# Altium footprint library Active.PcbLib: 308 footprints (part 20 of 22)
Each footprint in its own frame and in the unit in brackets; x right, y up, seen from the top. Pads: shape width x height; smd on the part's side, far side on the other; paste and mask are expansions set on the pad; w line width, h text height; cw(c..) or ccw(c..) is an arc to the next point about the centre after c.
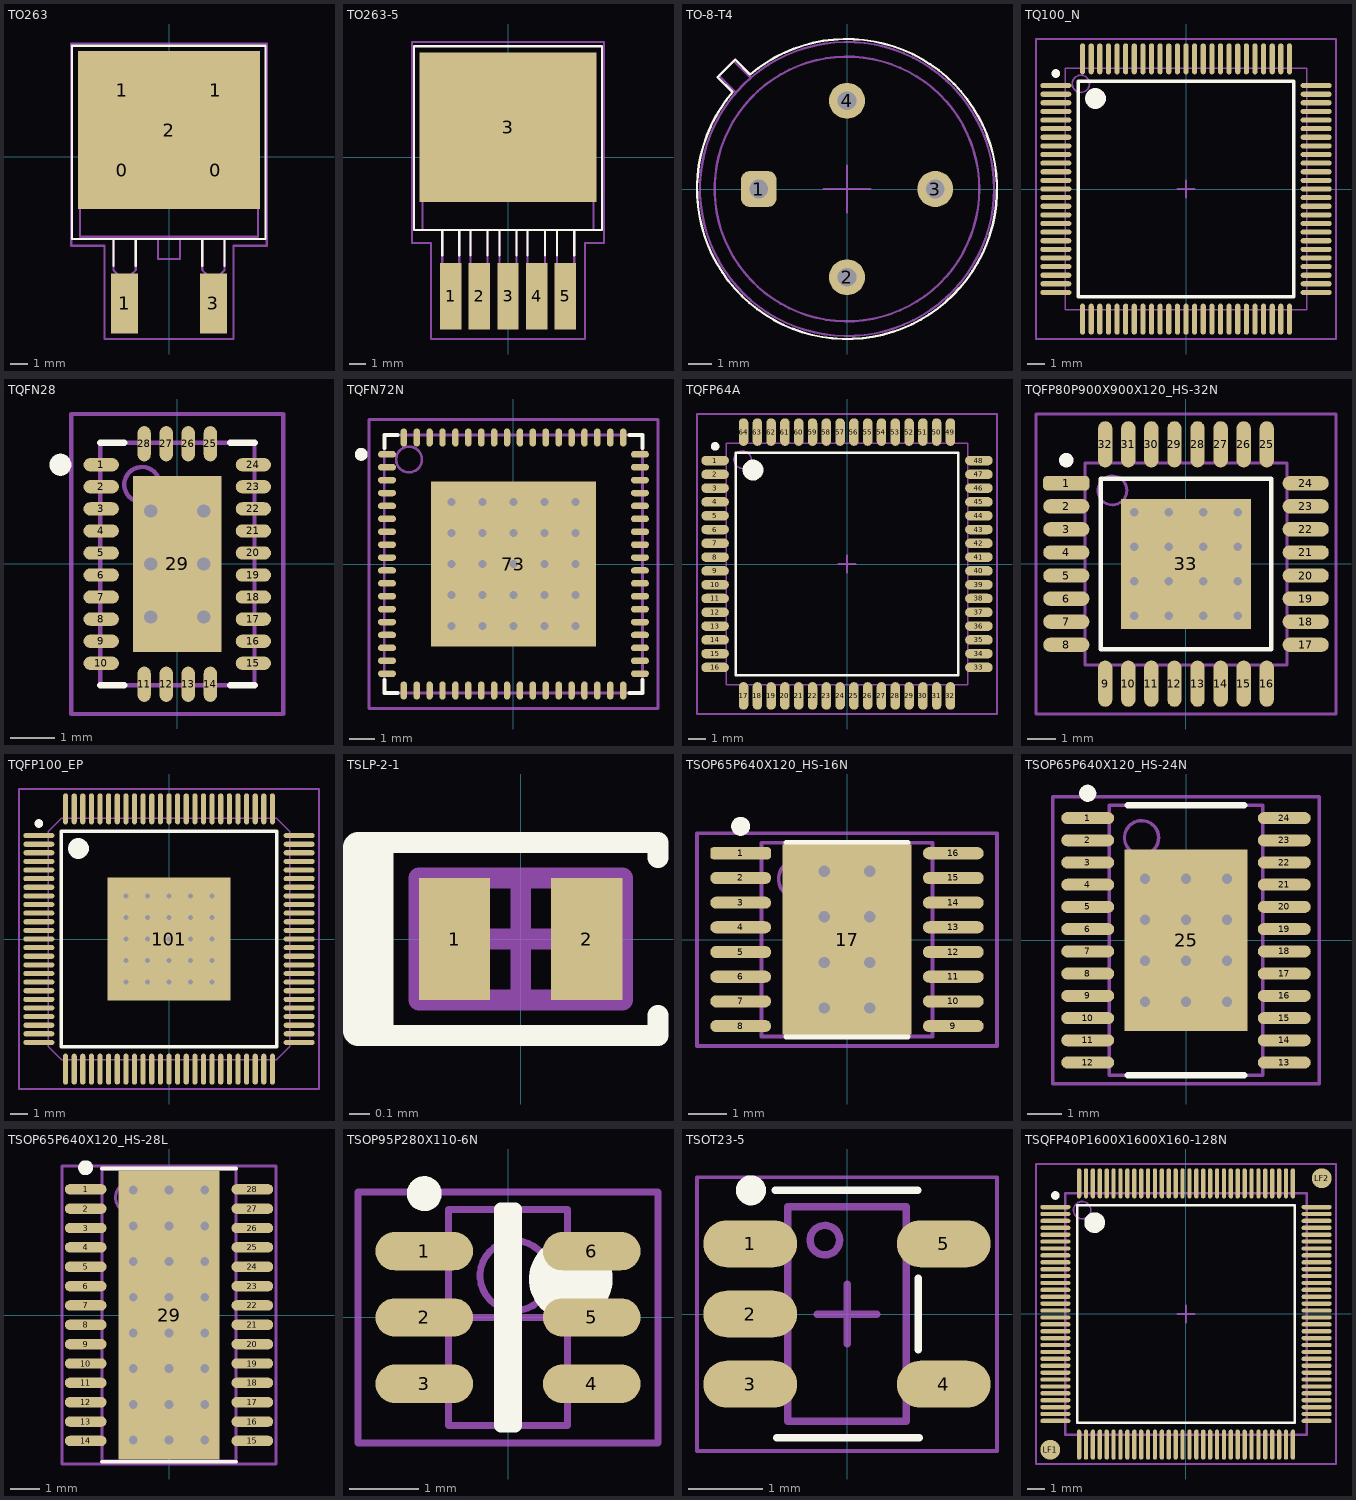
[diagram p19: the footprints below, top view; thin cyan lines are the x and y axes]

## TO263 [mil] "TO263 3pin D2PAK"
height 137.8
pads (7):
  rrect8% 190x160 on Top Paste mask+275.59: 0(-105,-30) 0(105,-30) 1(-105,150) 1(105,150)
  rect 60x135 smd: 1(-100,-330) 3(100,-330)
  rect 410x355 smd paste-196.85: 2(0,60)
Top Overlay:
  lines w5: -125,-245 -125,-185 ; -75,-245 -75,-185 ; 75,-245 75,-185 ; 125,-245 125,-185 ; -218,-185 -218,250 217,250 217,-185 -218,-185
Mechanical 13:
  lines w5: -125,-180 -125,-255 -115,-265 -115,-370 -85,-370 -85,-265 -75,-255 -75,-180 ; -25,-180 -25,-230 25,-230 25,-180 ; 75,-180 75,-255 85,-265 85,-370 115,-370 115,-265 125,-255 125,-180 ; -200,-180 -200,215 -120,230 120,230 200,215 200,-180 -200,-180
  lines w6: -200,180 200,180
Mechanical 15:
  lines w5: -220,-200 -145,-200 -145,-410 145,-410 145,-200 220,-200 220,255 -220,255 -220,-200
3D body: height 105, standoff 80, extent -25,-230 25,-180
3D body: height 105, standoff 80, extent 75,-265 125,-180
3D body: height 105, standoff 0, extent 85,-280 115,-265
3D body: height 20, standoff 0, extent 85,-370 115,-280
3D body: height 20, standoff 0, extent -115,-370 -85,-280
3D body: height 105, standoff 0, extent -115,-280 -85,-265
3D body: height 105, standoff 80, extent -125,-265 -75,-180
3D body: height 175, standoff 0, extent -200,-180 200,180
3D body: height 50, standoff 0, extent -200,180 200,230

## TO263-5 [mil]
height 137.8
pads (6):
  rect 50x155 smd: 1(-134,-325) 2(-67,-325) 3(0,-325) 4(67,-325) 5(134,-325)
  rect 414.02x350 smd paste-393.7: 3(0,70)
Top Overlay:
  lines w5: -154,-230 -154,-170 ; -114,-230 -114,-170 ; -88,-230 -88,-170 ; -48,-230 -48,-170 ; -20,-230 -20,-170 ; 20,-230 20,-170 ; 46,-230 46,-170 ; 87,-230 87,-170 ; 115,-230 115,-170 ; 155,-230 155,-170 ; -220,-170 220,-170 220,260 -220,260 -220,-170
Top Paste:
  circle w35.43: c165.35,-59.06 r17.72
  circle w35.43: c82.68,-59.06 r17.72
  circle w35.43: c-165.35,-59.06 r17.72
  circle w35.43: c-82.68,-59.06 r17.72
  circle w35.43: c0,-59.06 r17.72
  circle w35.43: c0,27.56 r17.72
  circle w35.43: c-82.68,27.56 r17.72
  circle w35.43: c-165.35,27.56 r17.72
  circle w35.43: c82.68,27.56 r17.72
  circle w35.43: c165.35,27.56 r17.72
  circle w35.43: c0,114.17 r17.72
  circle w35.43: c-82.68,114.17 r17.72
  circle w35.43: c-165.35,114.17 r17.72
  circle w35.43: c82.68,114.17 r17.72
  circle w35.43: c165.35,114.17 r17.72
  circle w35.43: c0,200.79 r17.72
  circle w35.43: c-82.68,200.79 r17.72
  circle w35.43: c-165.35,200.79 r17.72
  circle w35.43: c82.68,200.79 r17.72
  circle w35.43: c165.35,200.79 r17.72
Mechanical 13:
  lines w5: -154,-170 -154,-340 -114,-340 -114,-170 ; -88,-170 -88,-340 -48,-340 -48,-170 200,-170 ; -20,-170 -20,-340 20,-340 20,-170 ; 46,-170 46,-340 86,-340 ; 87,-340 87,-170 ; 115,-170 115,-340 155,-340 155,-170 ; -200,170 200,170 ; -200,170 -200,-170 200,-170 ; -200,170 -200,220 200,220 200,170 ; 200,-170 200,170
Mechanical 15:
  lines w4: -40,0 40,0 ; 0,-40 0,40
  lines w5: -225,-200 -180,-200 -180,-425 180,-425 180,-200 225,-200 225,270 -225,270 -225,-200
3D body: height 137.8, standoff 0, extent -200,-170 200,170
3D body: height 39.37, standoff 0, extent -200,170 200,220

## TO-8-T4 [mm] "TO-8 4pin metal"
height 7
pads (4):
  rrect50% 1.55x1.55 hole 0.8: 1(-3.81,0)
  round 1.55 hole 0.8: 2(0,-3.81) 3(3.81,0) 4(0,3.81)
Top Overlay:
  lines w0.1: -4.944,4.184 ccw(c0,0) -4.184,4.944
  lines w0.102: -4.944,4.184 -5.587,4.826 -5.588,4.826 -4.826,5.588 -4.184,4.946 -4.184,4.944
Mechanical 13:
  circle w0.1: c0,0 r6.35
  circle w0.1: c0,0 r5.715
  lines w0.102: -4.826,4.191 -5.524,4.889 -4.889,5.524 -4.191,4.826
Mechanical 15:
  lines w0.102: -1.016,0 1.016,0 ; 0,-1.016 0,1.016
3D body: height 7, standoff 0, extent -5.715,-5.715 5.715,5.715
3D body: height 1, standoff 0, extent -6.35,-6.35 6.35,6.35
3D body: height 1, standoff 0, extent -5.524,4.191 -4.191,5.524

## TQ100_N [mm] "Thin QFP 100, 14x14mm, R0.5mm, IPC Medium Density"
height 1.6
pads (100):
  oval 1.8x0.3 smd mask+0.051: 1(-7.55,6) 2(-7.55,5.5) 3(-7.55,5) 4(-7.55,4.5) 5(-7.55,4) 6(-7.55,3.5) 7(-7.55,3) 8(-7.55,2.5) 9(-7.55,2) 10(-7.55,1.5) 11(-7.55,1) 12(-7.55,0.5) 13(-7.55,0) 14(-7.55,-0.5) 15(-7.55,-1) 16(-7.55,-1.5) 17(-7.55,-2) 18(-7.55,-2.5) 19(-7.55,-3) 20(-7.55,-3.5) 21(-7.55,-4) 22(-7.55,-4.5) 23(-7.55,-5) 24(-7.55,-5.5) 25(-7.55,-6) 51(7.55,-6) 52(7.55,-5.5) 53(7.55,-5) 54(7.55,-4.5) 55(7.55,-4) 56(7.55,-3.5) 57(7.55,-3) 58(7.55,-2.5) 59(7.55,-2) 60(7.55,-1.5) 61(7.55,-1) 62(7.55,-0.5) 63(7.55,0) 64(7.55,0.5) 65(7.55,1) 66(7.55,1.5) 67(7.55,2) 68(7.55,2.5) 69(7.55,3) 70(7.55,3.5) 71(7.55,4) 72(7.55,4.5) 73(7.55,5) 74(7.55,5.5) 75(7.55,6)
  oval 0.3x1.8 smd mask+0.051: 26(-6,-7.55) 27(-5.5,-7.55) 28(-5,-7.55) 29(-4.5,-7.55) 30(-4,-7.55) 31(-3.5,-7.55) 32(-3,-7.55) 33(-2.5,-7.55) 34(-2,-7.55) 35(-1.5,-7.55) 36(-1,-7.55) 37(-0.5,-7.55) 38(0,-7.55) 39(0.5,-7.55) 40(1,-7.55) 41(1.5,-7.55) 42(2,-7.55) 43(2.5,-7.55) 44(3,-7.55) 45(3.5,-7.55) 46(4,-7.55) 47(4.5,-7.55) 48(5,-7.55) 49(5.5,-7.55) 50(6,-7.55) 76(6,7.55) 77(5.5,7.55) 78(5,7.55) 79(4.5,7.55) 80(4,7.55) 81(3.5,7.55) 82(3,7.55) 83(2.5,7.55) 84(2,7.55) 85(1.5,7.55) 86(1,7.55) 87(0.5,7.55) 88(0,7.55) 89(-0.5,7.55) 90(-1,7.55) 91(-1.5,7.55) 92(-2,7.55) 93(-2.5,7.55) 94(-3,7.55) 95(-3.5,7.55) 96(-4,7.55) 97(-4.5,7.55) 98(-5,7.55) 99(-5.5,7.55) 100(-6,7.55)
Top Overlay:
  circle w0.6: c-5.25,5.25 r0.3
  circle w0.25: c-7.55,6.7 r0.125
  lines w0.2: -6.25,-6.25 6.25,-6.25 6.25,6.25 -6.25,6.25 -6.25,-6.25
Mechanical 13:
  circle w0.1: c-6.1,6.1 r0.5
  lines w0.1: -7,-7 7,-7 7,7 -7,7 -7,-7
Mechanical 15:
  lines w0.1: -0.5,0 0.5,0 ; 0,-0.5 0,0.5 ; -8.7,-8.7 8.7,-8.7 8.7,8.7 -8.7,8.7 -8.7,-8.7
3D body: height 1.6, standoff 0, extent -7,-7 7,7

## TQFN28 [mm] "TQFN 28pin 0.8mm R0.5mm"
height 0.8
pads (29):
  oval 0.8x0.3 smd mask+0.025: 1(-1.725,2.25) 2(-1.725,1.75) 3(-1.725,1.25) 4(-1.725,0.75) 5(-1.725,0.25) 6(-1.725,-0.25) 7(-1.725,-0.75) 8(-1.725,-1.25) 9(-1.725,-1.75) 10(-1.725,-2.25) 15(1.725,-2.25) 16(1.725,-1.75) 17(1.725,-1.25) 18(1.725,-0.75) 19(1.725,-0.25) 20(1.725,0.25) 21(1.725,0.75) 22(1.725,1.25) 23(1.725,1.75) 24(1.725,2.25)
  oval 0.3x0.8 smd mask+0.025: 11(-0.75,-2.725) 12(-0.25,-2.725) 13(0.25,-2.725) 14(0.75,-2.725) 25(0.75,2.725) 26(0.25,2.725) 27(-0.25,2.725) 28(-0.75,2.725)
  rect 2x4 smd paste-5 mask-3: 29(0,0)
via 0.6,-1.2 diameter 0.65 hole 0.3
via -0.6,-1.2 diameter 0.65 hole 0.3
via 0.6,0 diameter 0.65 hole 0.3
via -0.6,0 diameter 0.65 hole 0.3
via 0.6,1.2 diameter 0.65 hole 0.3
via -0.6,1.2 diameter 0.65 hole 0.3
Top Overlay:
  circle w0.25: c-2.65,2.25 r0.125
  lines w0.15: -1.75,-2.75 -1.2,-2.75 ; -1.75,2.75 -1.2,2.75 ; 1.2,-2.75 1.75,-2.75 ; 1.2,2.75 1.75,2.75
Top Paste:
  region: -0.9,-0.85 -0.475,-0.85 -0.25,-1.075 0.25,-1.075 0.475,-0.85 0.9,-0.85 0.9,-0.35 0.475,-0.35 0.275,-0.15 -0.275,-0.15 -0.475,-0.35 -0.9,-0.35
  region: -0.9,-1.9 -0.9,-1.55 -0.475,-1.55 -0.25,-1.325 0.25,-1.325 0.475,-1.55 0.9,-1.55 0.9,-1.9
  region: -0.9,1.9 -0.9,1.55 -0.475,1.55 -0.25,1.325 0.25,1.325 0.475,1.55 0.9,1.55 0.9,1.9
  region: -0.9,0.85 -0.475,0.85 -0.25,1.075 0.25,1.075 0.475,0.85 0.9,0.85 0.9,0.35 0.475,0.35 0.275,0.15 -0.275,0.15 -0.475,0.35 -0.9,0.35
Top Solder:
  region: -1,2 -1,1.2 -0.931,1.2 -0.906,1.327 -0.834,1.434 -0.727,1.506 -0.6,1.531 -0.473,1.506 -0.366,1.434 -0.294,1.327 -0.269,1.2 -0.275,1.2 -0.269,1.2 -0.294,1.073 -0.366,0.966 -0.473,0.894 -0.6,0.869 -0.727,0.894 -0.834,0.966 -0.906,1.073 -0.931,1.2 -0.925,1.2 -1,1.2 -1,0 -0.931,0 -0.906,0.127 -0.834,0.234 -0.727,0.306 -0.6,0.331 -0.473,0.306 -0.366,0.234 -0.294,0.127 -0.269,0 -0.275,0 -0.269,0 -0.294,-0.127 -0.366,-0.234 -0.473,-0.306 -0.6,-0.331 -0.727,-0.306 -0.834,-0.234 -0.906,-0.127 -0.931,0 -0.925,0 -1,0 -1,-1.2 -0.931,-1.2 -0.906,-1.073 -0.834,-0.966 -0.727,-0.894 -0.6,-0.869 -0.473,-0.894 -0.366,-0.966 -0.294,-1.073 -0.269,-1.2 -0.275,-1.2 -0.269,-1.2 -0.294,-1.327 -0.366,-1.434 -0.473,-1.506 -0.6,-1.531 -0.727,-1.506 -0.834,-1.434 -0.906,-1.327 -0.931,-1.2 -0.925,-1.2 -1,-1.2 -1,-2 1,-2 1,-1.2 0.931,-1.2 0.906,-1.327 0.834,-1.434 0.727,-1.506 0.6,-1.531 0.473,-1.506 0.366,-1.434 0.294,-1.327 0.269,-1.2 0.275,-1.2 0.269,-1.2 0.294,-1.073 0.366,-0.966 0.473,-0.894 0.6,-0.869 0.727,-0.894 0.834,-0.966 0.906,-1.073 0.931,-1.2 0.925,-1.2 1,-1.2 1,0 0.931,0 0.906,-0.127 0.834,-0.234 0.727,-0.306 0.6,-0.331 0.473,-0.306 0.366,-0.234 0.294,-0.127 0.269,0 0.275,0 0.269,0 0.294,0.127 0.366,0.234 0.473,0.306 0.6,0.331 0.727,0.306 0.834,0.234 0.906,0.127 0.931,0 0.925,0 1,0 1,1.2 0.931,1.2 0.906,1.073 0.834,0.966 0.727,0.894 0.6,0.869 0.473,0.894 0.366,0.966 0.294,1.073 0.269,1.2 0.275,1.2 0.269,1.2 0.294,1.327 0.366,1.434 0.473,1.506 0.6,1.531 0.727,1.506 0.834,1.434 0.906,1.327 0.931,1.2 0.925,1.2 1,1.2 1,2
Mechanical 12:
  circle w0.4: c-0.6,1.2 r0.15
  circle w0.4: c0.6,1.2 r0.15
  circle w0.4: c-0.6,0 r0.15
  circle w0.4: c0.6,0 r0.15
  circle w0.4: c-0.6,-1.2 r0.15
  circle w0.4: c0.6,-1.2 r0.15
Mechanical 13:
  circle w0.1: c-0.8,1.8 r0.4
  lines w0.1: -1.75,-2.75 1.75,-2.75 1.75,2.75 -1.75,2.75 -1.75,-2.75
Mechanical 15:
  lines w0.1: -0.5,0 0.5,0 ; 0,-0.5 0,0.5 ; -2.4,-3.4 2.4,-3.4 2.4,3.4 -2.4,3.4 -2.4,-3.4
3D body: height 0.8, standoff 0.01, extent -1.75,-2.75 1.75,2.75
3D body: height 0.81, standoff 0.8, extent -1.208,1.392 -0.392,2.208

## TQFN72N [mm]
height 0.8
pads (73):
  oval 0.7x0.25 smd mask+0.025: 1(-4.9,4.25) 2(-4.9,3.75) 3(-4.9,3.25) 4(-4.9,2.75) 5(-4.9,2.25) 6(-4.9,1.75) 7(-4.9,1.25) 8(-4.9,0.75) 9(-4.9,0.25) 10(-4.9,-0.25) 11(-4.9,-0.75) 12(-4.9,-1.25) 13(-4.9,-1.75) 14(-4.9,-2.25) 15(-4.9,-2.75) 16(-4.9,-3.25) 17(-4.9,-3.75) 18(-4.9,-4.25) 37(4.9,-4.25) 38(4.9,-3.75) 39(4.9,-3.25) 40(4.9,-2.75) 41(4.9,-2.25) 42(4.9,-1.75) 43(4.9,-1.25) 44(4.9,-0.75) 45(4.9,-0.25) 46(4.9,0.25) 47(4.9,0.75) 48(4.9,1.25) 49(4.9,1.75) 50(4.9,2.25) 51(4.9,2.75) 52(4.9,3.25) 53(4.9,3.75) 54(4.9,4.25)
  oval 0.25x0.7 smd mask+0.025: 19(-4.25,-4.9) 20(-3.75,-4.9) 21(-3.25,-4.9) 22(-2.75,-4.9) 23(-2.25,-4.9) 24(-1.75,-4.9) 25(-1.25,-4.9) 26(-0.75,-4.9) 27(-0.25,-4.9) 28(0.25,-4.9) 29(0.75,-4.9) 30(1.25,-4.9) 31(1.75,-4.9) 32(2.25,-4.9) 33(2.75,-4.9) 34(3.25,-4.9) 35(3.75,-4.9) 36(4.25,-4.9) 55(4.25,4.9) 56(3.75,4.9) 57(3.25,4.9) 58(2.75,4.9) 59(2.25,4.9) 60(1.75,4.9) 61(1.25,4.9) 62(0.75,4.9) 63(0.25,4.9) 64(-0.25,4.9) 65(-0.75,4.9) 66(-1.25,4.9) 67(-1.75,4.9) 68(-2.25,4.9) 69(-2.75,4.9) 70(-3.25,4.9) 71(-3.75,4.9) 72(-4.25,4.9)
  rect 6.4x6.4 smd paste-7.62 mask-8: 73(0,0)
via 2.4,-2.4 diameter 0.65 hole 0.3
via 1.2,-2.4 diameter 0.65 hole 0.3
via 0,-2.4 diameter 0.65 hole 0.3
via -1.2,-2.4 diameter 0.65 hole 0.3
via -2.4,-2.4 diameter 0.65 hole 0.3
via 2.4,-1.2 diameter 0.65 hole 0.3
via 1.2,-1.2 diameter 0.65 hole 0.3
via 0,-1.2 diameter 0.65 hole 0.3
via -1.2,-1.2 diameter 0.65 hole 0.3
via -2.4,-1.2 diameter 0.65 hole 0.3
via 2.4,0 diameter 0.65 hole 0.3
via 1.2,0 diameter 0.65 hole 0.3
via 0,0 diameter 0.65 hole 0.3
via -1.2,0 diameter 0.65 hole 0.3
via -2.4,0 diameter 0.65 hole 0.3
via 2.4,1.2 diameter 0.65 hole 0.3
via 1.2,1.2 diameter 0.65 hole 0.3
via 0,1.2 diameter 0.65 hole 0.3
via -1.2,1.2 diameter 0.65 hole 0.3
via -2.4,1.2 diameter 0.65 hole 0.3
via 2.4,2.4 diameter 0.65 hole 0.3
via 1.2,2.4 diameter 0.65 hole 0.3
via 0,2.4 diameter 0.65 hole 0.3
via -1.2,2.4 diameter 0.65 hole 0.3
via -2.4,2.4 diameter 0.65 hole 0.3
Top Overlay:
  circle w0.25: c-5.9,4.25 r0.125
  lines w0.15: -5,-4.5 -5,-5 -4.5,-5 ; -5,4.5 -5,5 -4.5,5 ; 4.5,-5 5,-5 5,-4.5 ; 4.5,5 5,5 5,4.5
Top Paste:
  drawing of 36 lines, arcs and shapes, not listed
Top Solder:
  drawing of 2 lines, arcs and shapes, not listed
Mechanical 12:
  circle w0.4: c-2.4,2.4 r0.15
  circle w0.4: c-1.2,2.4 r0.15
  circle w0.4: c0,2.4 r0.15
  circle w0.4: c1.2,2.4 r0.15
  circle w0.4: c2.4,2.4 r0.15
  circle w0.4: c-2.4,1.2 r0.15
  circle w0.4: c-1.2,1.2 r0.15
  circle w0.4: c0,1.2 r0.15
  circle w0.4: c1.2,1.2 r0.15
  circle w0.4: c2.4,1.2 r0.15
  circle w0.4: c-2.4,0 r0.15
  circle w0.4: c-1.2,0 r0.15
  circle w0.4: c0,0 r0.15
  circle w0.4: c1.2,0 r0.15
  circle w0.4: c2.4,0 r0.15
  circle w0.4: c-2.4,-1.2 r0.15
  circle w0.4: c-1.2,-1.2 r0.15
  circle w0.4: c0,-1.2 r0.15
  circle w0.4: c1.2,-1.2 r0.15
  circle w0.4: c2.4,-1.2 r0.15
  circle w0.4: c-2.4,-2.4 r0.15
  circle w0.4: c-1.2,-2.4 r0.15
  circle w0.4: c0,-2.4 r0.15
  circle w0.4: c1.2,-2.4 r0.15
  circle w0.4: c2.4,-2.4 r0.15
Mechanical 13:
  circle w0.1: c-4.05,4.05 r0.5
  lines w0.1: -5,-5 5,-5 5,5 -5,5 -5,-5
Mechanical 15:
  lines w0.1: -0.5,0 0.5,0 ; 0,-0.5 0,0.5 ; -5.6,-5.6 5.6,-5.6 5.6,5.6 -5.6,5.6 -5.6,-5.6
3D body: height 0.81, standoff 0.8, extent -4.56,3.54 -3.54,4.56
3D body: height 0.8, standoff 0.01, extent -5,-5 5,5

## TQFP64A [mm] "TQFP, 64-Leads, Body 16,0x16,0mm (max), Pitch 0,80mm, IPC Medium Density"
height 1
pads (64):
  oval 1.6x0.55 smd mask+0.051: 1(-7.65,6) 2(-7.65,5.2) 3(-7.65,4.4) 4(-7.65,3.6) 5(-7.65,2.8) 6(-7.65,2) 7(-7.65,1.2) 8(-7.65,0.4) 9(-7.65,-0.4) 10(-7.65,-1.2) 11(-7.65,-2) 12(-7.65,-2.8) 13(-7.65,-3.6) 14(-7.65,-4.4) 15(-7.65,-5.2) 16(-7.65,-6) 33(7.65,-6) 34(7.65,-5.2) 35(7.65,-4.4) 36(7.65,-3.6) 37(7.65,-2.8) 38(7.65,-2) 39(7.65,-1.2) 40(7.65,-0.4) 41(7.65,0.4) 42(7.65,1.2) 43(7.65,2) 44(7.65,2.8) 45(7.65,3.6) 46(7.65,4.4) 47(7.65,5.2) 48(7.65,6)
  oval 0.55x1.6 smd mask+0.051: 17(-6,-7.65) 18(-5.2,-7.65) 19(-4.4,-7.65) 20(-3.6,-7.65) 21(-2.8,-7.65) 22(-2,-7.65) 23(-1.2,-7.65) 24(-0.4,-7.65) 25(0.4,-7.65) 26(1.2,-7.65) 27(2,-7.65) 28(2.8,-7.65) 29(3.6,-7.65) 30(4.4,-7.65) 31(5.2,-7.65) 32(6,-7.65) 49(6,7.65) 50(5.2,7.65) 51(4.4,7.65) 52(3.6,7.65) 53(2.8,7.65) 54(2,7.65) 55(1.2,7.65) 56(0.4,7.65) 57(-0.4,7.65) 58(-1.2,7.65) 59(-2,7.65) 60(-2.8,7.65) 61(-3.6,7.65) 62(-4.4,7.65) 63(-5.2,7.65) 64(-6,7.65)
Top Overlay:
  circle w0.25: c-7.65,6.825 r0.125
  circle w0.6: c-5.45,5.45 r0.3
  lines w0.127: -6.45,-6.45 -6.45,6.45 6.45,6.45 6.45,-6.45 -6.45,-6.45
Mechanical 13:
  circle w0.1: c-6.05,6.05 r0.5
  lines w0.1: -7,-7 -7,7 7,7 7,-7 -7,-7
Mechanical 15:
  lines w0.1: -0.5,0 0.5,0 ; 0,-0.5 0,0.5 ; -8.7,-8.7 -8.7,8.7 8.7,8.7 8.7,-8.7 -8.7,-8.7
3D body: height 1, standoff 0.1, extent -7,-7 7,7
3D body: height 1.05, standoff 0.9, extent -6.56,5.54 -5.54,6.56

## TQFP80P900X900X120_HS-32N [mm] "TQFP, 32-Leads, Body 9,0x9,0mm (max), Pitch 0,80mm, IPC Medium Density"
height 1.2
pads (33):
  rrect50% 1.6x0.5 smd mask+0.051: 1(-4.15,2.8)
  oval 1.6x0.5 smd mask+0.051: 2(-4.15,2) 3(-4.15,1.2) 4(-4.15,0.4) 5(-4.15,-0.4) 6(-4.15,-1.2) 7(-4.15,-2) 8(-4.15,-2.8) 17(4.15,-2.8) 18(4.15,-2) 19(4.15,-1.2) 20(4.15,-0.4) 21(4.15,0.4) 22(4.15,1.2) 23(4.15,2) 24(4.15,2.8)
  oval 0.5x1.6 smd mask+0.051: 9(-2.8,-4.15) 10(-2,-4.15) 11(-1.2,-4.15) 12(-0.4,-4.15) 13(0.4,-4.15) 14(1.2,-4.15) 15(2,-4.15) 16(2.8,-4.15) 25(2.8,4.15) 26(2,4.15) 27(1.2,4.15) 28(0.4,4.15) 29(-0.4,4.15) 30(-1.2,4.15) 31(-2,4.15) 32(-2.8,4.15)
  rect 4.5x4.5 smd paste-4 mask-5: 33(0,0)
via 1.8,-1.8 diameter 0.65 hole 0.3
via 0.6,-1.8 diameter 0.65 hole 0.3
via -0.6,-1.8 diameter 0.65 hole 0.3
via -1.8,-1.8 diameter 0.65 hole 0.3
via 1.8,-0.6 diameter 0.65 hole 0.3
via 0.6,-0.6 diameter 0.65 hole 0.3
via -0.6,-0.6 diameter 0.65 hole 0.3
via -1.8,-0.6 diameter 0.65 hole 0.3
via 1.8,0.6 diameter 0.65 hole 0.3
via 0.6,0.6 diameter 0.65 hole 0.3
via -0.6,0.6 diameter 0.65 hole 0.3
via -1.8,0.6 diameter 0.65 hole 0.3
via 1.8,1.8 diameter 0.65 hole 0.3
via 0.6,1.8 diameter 0.65 hole 0.3
via -0.6,1.8 diameter 0.65 hole 0.3
via -1.8,1.8 diameter 0.65 hole 0.3
Top Overlay:
  circle w0.25: c-4.15,3.6 r0.125
  lines w0.15: -2.95,-2.95 2.95,-2.95 2.95,2.95 -2.95,2.95 -2.95,-2.95
Top Paste:
  region: -0.45,0.3 -0.45,-0.3 -0.3,-0.45 0.3,-0.45 0.45,-0.3 0.45,0.3 0.3,0.45 -0.3,0.45
  region: 0.3,-2.15 -0.3,-2.15 -0.3,-0.75 0.3,-0.75
  region: 1.5,-2.15 1.494,-1.8 1.517,-1.683 1.584,-1.584 1.683,-1.517 1.8,-1.494 1.8,-1.5 2.15,-1.5 2.15,-0.9 1.8,-0.906 1.683,-0.883 1.584,-0.816 1.517,-0.717 1.494,-0.6 1.5,-0.6 0.906,-0.6 0.883,-0.717 0.816,-0.816 0.717,-0.883 0.6,-0.906 0.6,-0.9 0.6,-1.5 0.6,-1.494 0.717,-1.517 0.816,-1.584 0.883,-1.683 0.906,-1.8 0.9,-1.8 0.9,-2.15
  region: -2.15,-0.3 -2.15,0.3 -0.75,0.3 -0.75,-0.3
  region: -2.15,-1.5 -1.8,-1.494 -1.683,-1.517 -1.584,-1.584 -1.517,-1.683 -1.494,-1.8 -1.5,-1.8 -1.5,-2.15 -0.9,-2.15 -0.906,-1.8 -0.883,-1.683 -0.816,-1.584 -0.717,-1.517 -0.6,-1.494 -0.6,-1.5 -0.6,-0.906 -0.717,-0.883 -0.816,-0.816 -0.883,-0.717 -0.906,-0.6 -0.9,-0.6 -1.5,-0.6 -1.494,-0.6 -1.517,-0.717 -1.584,-0.816 -1.683,-0.883 -1.8,-0.906 -1.8,-0.9 -2.15,-0.9
  region: 2.15,0.3 2.15,-0.3 0.75,-0.3 0.75,0.3
  region: 2.15,1.5 1.8,1.494 1.683,1.517 1.584,1.584 1.517,1.683 1.494,1.8 1.5,1.8 1.5,2.15 0.9,2.15 0.906,1.8 0.883,1.683 0.816,1.584 0.717,1.517 0.6,1.494 0.6,1.5 0.6,0.906 0.717,0.883 0.816,0.816 0.883,0.717 0.906,0.6 0.9,0.6 1.5,0.6 1.494,0.6 1.517,0.717 1.584,0.816 1.683,0.883 1.8,0.906 1.8,0.9 2.15,0.9
  region: -1.5,2.15 -1.494,1.8 -1.517,1.683 -1.584,1.584 -1.683,1.517 -1.8,1.494 -1.8,1.5 -2.15,1.5 -2.15,0.9 -1.8,0.906 -1.683,0.883 -1.584,0.816 -1.517,0.717 -1.494,0.6 -1.5,0.6 -0.906,0.6 -0.883,0.717 -0.816,0.816 -0.717,0.883 -0.6,0.906 -0.6,0.9 -0.6,1.5 -0.6,1.494 -0.717,1.517 -0.816,1.584 -0.883,1.683 -0.906,1.8 -0.9,1.8 -0.9,2.15
  region: -0.3,2.15 0.3,2.15 0.3,0.75 -0.3,0.75
Top Solder:
  drawing of 1 lines, arcs and shapes, not listed
Mechanical 12:
  circle w0.4: c1.8,-1.8 r0.15
  circle w0.4: c0.6,-1.8 r0.15
  circle w0.4: c-0.6,-1.8 r0.15
  circle w0.4: c-1.8,-1.8 r0.15
  circle w0.4: c1.8,-0.6 r0.15
  circle w0.4: c0.6,-0.6 r0.15
  circle w0.4: c-0.6,-0.6 r0.15
  circle w0.4: c-1.8,-0.6 r0.15
  circle w0.4: c1.8,0.6 r0.15
  circle w0.4: c0.6,0.6 r0.15
  circle w0.4: c-0.6,0.6 r0.15
  circle w0.4: c-1.8,0.6 r0.15
  circle w0.4: c1.8,1.8 r0.15
  circle w0.4: c0.6,1.8 r0.15
  circle w0.4: c-0.6,1.8 r0.15
  circle w0.4: c-1.8,1.8 r0.15
Mechanical 13:
  circle w0.1: c-2.55,2.55 r0.5
  lines w0.1: -3.5,-3.5 3.5,-3.5 3.5,3.5 -3.5,3.5 -3.5,-3.5
Mechanical 15:
  lines w0.1: -0.5,0 0.5,0 ; 0,-0.5 0,0.5 ; -5.2,-5.2 5.2,-5.2 5.2,5.2 -5.2,5.2 -5.2,-5.2
3D body: height 1.21, standoff 1.2, extent -3.058,2.048 -2.04,3.058
3D body: height 1.2, standoff 0.1, extent -3.5,-3.5 3.5,3.5

## TQFP100_EP [mm] "Thin QFP 100, 14x14mm, R0.5mm, IPC Medium Density"
height 1.2
pads (101):
  oval 1.8x0.3 smd mask+0.038: 1(-7.55,6) 2(-7.55,5.5) 3(-7.55,5) 4(-7.55,4.5) 5(-7.55,4) 6(-7.55,3.5) 7(-7.55,3) 8(-7.55,2.5) 9(-7.55,2) 10(-7.55,1.5) 11(-7.55,1) 12(-7.55,0.5) 13(-7.55,0) 14(-7.55,-0.5) 15(-7.55,-1) 16(-7.55,-1.5) 17(-7.55,-2) 18(-7.55,-2.5) 19(-7.55,-3) 20(-7.55,-3.5) 21(-7.55,-4) 22(-7.55,-4.5) 23(-7.55,-5) 24(-7.55,-5.5) 25(-7.55,-6) 51(7.55,-6) 52(7.55,-5.5) 53(7.55,-5) 54(7.55,-4.5) 55(7.55,-4) 56(7.55,-3.5) 57(7.55,-3) 58(7.55,-2.5) 59(7.55,-2) 60(7.55,-1.5) 61(7.55,-1) 62(7.55,-0.5) 63(7.55,0) 64(7.55,0.5) 65(7.55,1) 66(7.55,1.5) 67(7.55,2) 68(7.55,2.5) 69(7.55,3) 70(7.55,3.5) 71(7.55,4) 72(7.55,4.5) 73(7.55,5) 74(7.55,5.5) 75(7.55,6)
  oval 0.3x1.8 smd mask+0.038: 26(-6,-7.55) 27(-5.5,-7.55) 28(-5,-7.55) 29(-4.5,-7.55) 30(-4,-7.55) 31(-3.5,-7.55) 32(-3,-7.55) 33(-2.5,-7.55) 34(-2,-7.55) 35(-1.5,-7.55) 36(-1,-7.55) 37(-0.5,-7.55) 38(0,-7.55) 39(0.5,-7.55) 40(1,-7.55) 41(1.5,-7.55) 42(2,-7.55) 43(2.5,-7.55) 44(3,-7.55) 45(3.5,-7.55) 46(4,-7.55) 47(4.5,-7.55) 48(5,-7.55) 49(5.5,-7.55) 50(6,-7.55) 76(6,7.55) 77(5.5,7.55) 78(5,7.55) 79(4.5,7.55) 80(4,7.55) 81(3.5,7.55) 82(3,7.55) 83(2.5,7.55) 84(2,7.55) 85(1.5,7.55) 86(1,7.55) 87(0.5,7.55) 88(0,7.55) 89(-0.5,7.55) 90(-1,7.55) 91(-1.5,7.55) 92(-2,7.55) 93(-2.5,7.55) 94(-3,7.55) 95(-3.5,7.55) 96(-4,7.55) 97(-4.5,7.55) 98(-5,7.55) 99(-5.5,7.55) 100(-6,7.55)
  rect 7.15x7.15 smd paste-5 mask-5: 101(0,0)
via -2.5,-2.5 diameter 0.65 hole 0.3
via -2.5,-1.25 diameter 0.65 hole 0.3
via -1.25,-2.5 diameter 0.65 hole 0.3
via -1.25,-1.25 diameter 0.65 hole 0.3
via 1.25,-2.5 diameter 0.65 hole 0.3
via 1.25,-1.25 diameter 0.65 hole 0.3
via 2.5,-2.5 diameter 0.65 hole 0.3
via 2.5,-1.25 diameter 0.65 hole 0.3
via 2.5,2.5 diameter 0.65 hole 0.3
via 2.5,1.25 diameter 0.65 hole 0.3
via 1.25,2.5 diameter 0.65 hole 0.3
via 1.25,1.25 diameter 0.65 hole 0.3
via -1.25,2.5 diameter 0.65 hole 0.3
via -1.25,1.25 diameter 0.65 hole 0.3
via -2.5,2.5 diameter 0.65 hole 0.3
via -2.5,1.25 diameter 0.65 hole 0.3
via 0,0 diameter 0.65 hole 0.3
via -1.25,0 diameter 0.65 hole 0.3
via -2.5,0 diameter 0.65 hole 0.3
via 1.25,0 diameter 0.65 hole 0.3
via 2.5,0 diameter 0.65 hole 0.3
via 0,-2.5 diameter 0.65 hole 0.3
via 0,-1.25 diameter 0.65 hole 0.3
via 0,2.5 diameter 0.65 hole 0.3
via 0,1.25 diameter 0.65 hole 0.3
Top Overlay:
  circle w0.6: c-5.25,5.25 r0.3
  circle w0.25: c-7.55,6.7 r0.125
  lines w0.2: -6.25,-6.25 6.25,-6.25 6.25,6.25 -6.25,6.25 -6.25,-6.25
Top Paste:
  drawing of 36 lines, arcs and shapes, not listed
Top Solder:
  drawing of 1 lines, arcs and shapes, not listed
Mechanical 12:
  circle w0.4: c-2.5,-2.5 r0.15
  circle w0.4: c-2.5,-1.25 r0.15
  circle w0.4: c-1.25,-2.5 r0.15
  circle w0.4: c-1.25,-1.25 r0.15
  circle w0.4: c1.25,-2.5 r0.15
  circle w0.4: c1.25,-1.25 r0.15
  circle w0.4: c2.5,-2.5 r0.15
  circle w0.4: c2.5,-1.25 r0.15
  circle w0.4: c2.5,2.5 r0.15
  circle w0.4: c2.5,1.25 r0.15
  circle w0.4: c1.25,2.5 r0.15
  circle w0.4: c1.25,1.25 r0.15
  circle w0.4: c-1.25,2.5 r0.15
  circle w0.4: c-1.25,1.25 r0.15
  circle w0.4: c-2.5,2.5 r0.15
  circle w0.4: c-2.5,1.25 r0.15
  circle w0.4: c-1.25,0 r0.15
  circle w0.4: c-2.5,0 r0.15
  circle w0.4: c1.25,0 r0.15
  circle w0.4: c2.5,0 r0.15
  circle w0.4: c0,-2.5 r0.15
  circle w0.4: c0,-1.25 r0.15
  circle w0.4: c0,2.5 r0.15
  circle w0.4: c0,1.25 r0.15
  circle w0.4: c0,0 r0.15
Mechanical 13:
  circle w0.1: c-5.25,5.258 r0.5
  lines w0.1: -7,-6.233 -7,6.233 -6.233,7 6.233,7 7,6.233 7,-6.233 6.233,-7 -6.233,-7 -7,-6.233
Mechanical 15:
  lines w0.1: -0.5,0 0.5,0 ; 0,-0.5 0,0.5 ; -8.7,-8.7 8.7,-8.7 8.7,8.7 -8.7,8.7 -8.7,-8.7
3D body: height 1.05, standoff 0, extent -7,-7 7.01,7.01
3D body: height 1.05, standoff 0, extent -5.74,4.75 -4.728,5.764

## TSLP-2-1 [mm] "TSLP-2-1 diode"
height 0.4
pads (2):
  rect 0.35x0.6 smd: 1(-0.325,0) 2(0.325,0)
Top Overlay:
  lines w0.102: -0.8,-0.475 -0.7,-0.475 0.675,-0.475 0.675,-0.375 ; -0.8,0.475 -0.7,0.475 0.675,0.475 0.675,0.4
  lines w0.15: -0.8,-0.45 -0.8,0.45 ; -0.7,-0.45 -0.7,0.45
Mechanical 13:
  lines w0.102: -0.5,-0.3 -0.5,0.3 ; -0.5,-0.3 -0.5,0.3 ; -0.5,-0.3 0.5,-0.3 0.5,0.3 -0.5,0.3
Mechanical 15:
  lines w0.102: -0.3,0 0.3,0 ; 0,-0.3 0,0.3
3D body: height 0.41, standoff 0.4, extent -0.525,-0.3 -0.325,0.3
3D body: height 0.4, standoff 0, extent -0.525,-0.3 0.5,0.3

## TSOP65P640X120_HS-16N [mm] "TSOP, 16-Leads, Body 5,1x4,5mm (max), Pitch 0,65mm, IPC Medium Density"
height 1.2
pads (17):
  rrect50% 1.6x0.32 smd mask+0.051: 1(-2.8,2.275)
  oval 1.6x0.32 smd mask+0.051: 2(-2.8,1.625) 3(-2.8,0.975) 4(-2.8,0.325) 5(-2.8,-0.325) 6(-2.8,-0.975) 7(-2.8,-1.625) 8(-2.8,-2.275) 9(2.8,-2.275) 10(2.8,-1.625) 11(2.8,-0.975) 12(2.8,-0.325) 13(2.8,0.325) 14(2.8,0.975) 15(2.8,1.625) 16(2.8,2.275)
  rect 3.4x5 smd paste-5 mask-5: 17(0,0)
via -0.6,1.8 diameter 0.65 hole 0.3
via 0.6,1.8 diameter 0.65 hole 0.3
via 0.6,-1.8 diameter 0.65 hole 0.3
via -0.6,-1.8 diameter 0.65 hole 0.3
via 0.6,-0.6 diameter 0.65 hole 0.3
via -0.6,-0.6 diameter 0.65 hole 0.3
via 0.6,0.6 diameter 0.65 hole 0.3
via -0.6,0.6 diameter 0.65 hole 0.3
Top Overlay:
  circle w0.25: c-2.8,2.985 r0.125
  lines w0.15: -1.6,-2.55 1.6,-2.55 ; -1.6,2.55 1.6,2.55
Top Paste:
  region: -0.925,1.95 -0.75,2.125 -0.75,2.45 -1.65,2.45 -1.65,1.95
  region: -0.925,1.65 -0.75,1.475 -0.75,0.925 -0.925,0.75 -1.65,0.75 -1.65,1.65
  region: -0.45,1.475 -0.275,1.65 0.275,1.65 0.45,1.475 0.45,0.925 0.275,0.75 -0.275,0.75 -0.45,0.925
  region: -0.45,0.275 -0.275,0.45 0.275,0.45 0.45,0.275 0.45,-0.275 0.275,-0.45 -0.275,-0.45 -0.45,-0.275
  region: -0.45,-0.925 -0.275,-0.75 0.275,-0.75 0.45,-0.925 0.45,-1.475 0.275,-1.65 -0.275,-1.65 -0.45,-1.475
  region: -0.925,0.45 -0.75,0.275 -0.75,-0.275 -0.925,-0.45 -1.65,-0.45 -1.65,0.45
  region: -0.925,-0.75 -0.75,-0.925 -0.75,-1.475 -0.925,-1.65 -1.65,-1.65 -1.65,-0.75
  region: 0.925,-0.75 0.75,-0.925 0.75,-1.475 0.925,-1.65 1.65,-1.65 1.65,-0.75
  region: 0.925,0.45 0.75,0.275 0.75,-0.275 0.925,-0.45 1.65,-0.45 1.65,0.45
  region: 0.925,1.65 0.75,1.475 0.75,0.925 0.925,0.75 1.65,0.75 1.65,1.65
  region: -0.45,2.125 -0.275,1.95 0.275,1.95 0.45,2.125 0.45,2.45 -0.45,2.45
  region: -0.45,-2.125 -0.275,-1.95 0.275,-1.95 0.45,-2.125 0.45,-2.45 -0.45,-2.45
  region: 0.925,1.95 0.75,2.125 0.75,2.45 1.65,2.45 1.65,1.95
  region: 0.925,-1.95 0.75,-2.125 0.75,-2.45 1.65,-2.45 1.65,-1.95
  region: -0.925,-1.95 -0.75,-2.125 -0.75,-2.45 -1.65,-2.45 -1.65,-1.95
Top Solder:
  drawing of 8 lines, arcs and shapes, not listed
Mechanical 13:
  circle w0.1: c-1.3,1.6 r0.5
  lines w0.1: -2.25,-2.55 2.25,-2.55 2.25,2.55 -2.25,2.55 -2.25,-2.55
Mechanical 15:
  lines w0.1: -0.5,0 0.5,0 ; 0,-0.5 0,0.5 ; -3.95,-2.8 3.95,-2.8 3.95,2.8 -3.95,2.8 -3.95,-2.8
3D body: height 1.2, standoff 0.05, extent -2.25,-2.55 2.25,2.55

## TSOP65P640X120_HS-24N [mm] "TSOP, 24-Leads, Body 7,9x4,5mm (max), Pitch 0,65mm, IPC Medium Density"
height 1.2
pads (25):
  oval 1.55x0.35 smd mask+0.051: 1(-2.875,3.575) 2(-2.875,2.925) 3(-2.875,2.275) 4(-2.875,1.625) 5(-2.875,0.975) 6(-2.875,0.325) 7(-2.875,-0.325) 8(-2.875,-0.975) 9(-2.875,-1.625) 10(-2.875,-2.275) 11(-2.875,-2.925) 12(-2.875,-3.575) 13(2.875,-3.575) 14(2.875,-2.925) 15(2.875,-2.275) 16(2.875,-1.625) 17(2.875,-0.975) 18(2.875,-0.325) 19(2.875,0.325) 20(2.875,0.975) 21(2.875,1.625) 22(2.875,2.275) 23(2.875,2.925) 24(2.875,3.575)
  rect 3.6x5.3 smd paste-7 mask-7: 25(0,0)
via -1.2,1.8 diameter 0.65 hole 0.3
via 0,1.8 diameter 0.65 hole 0.3
via 1.2,1.8 diameter 0.65 hole 0.3
via -1.2,0.6 diameter 0.65 hole 0.3
via 0,0.6 diameter 0.65 hole 0.3
via 1.2,0.6 diameter 0.65 hole 0.3
via -1.2,-0.6 diameter 0.65 hole 0.3
via 0,-0.6 diameter 0.65 hole 0.3
via 1.2,-0.6 diameter 0.65 hole 0.3
via -1.2,-1.8 diameter 0.65 hole 0.3
via 0,-1.8 diameter 0.65 hole 0.3
via 1.2,-1.8 diameter 0.65 hole 0.3
Top Overlay:
  circle w0.25: c-2.875,4.3 r0.125
  lines w0.2: -1.7,-3.95 1.7,-3.95 ; -1.7,3.95 1.7,3.95
Top Paste:
  region: -1.525,-1.95 -1.35,-2.125 -1.35,-2.625 -1.775,-2.625 -1.775,-1.95
  region: 1.525,-1.95 1.35,-2.125 1.35,-2.625 1.775,-2.625 1.775,-1.95
  region: 1.525,1.95 1.35,2.125 1.35,2.625 1.775,2.625 1.775,1.95
  region: -1.525,1.95 -1.35,2.125 -1.35,2.625 -1.775,2.625 -1.775,1.95
  region: -1.092,2.625 -1.092,2.159 -0.813,1.88 -0.406,1.88 -0.127,2.159 -0.127,2.625
  region: 0.108,2.625 0.108,2.159 0.387,1.88 0.794,1.88 1.073,2.159 1.073,2.625
  region: -1.092,-2.625 -1.092,-2.159 -0.813,-1.88 -0.406,-1.88 -0.127,-2.159 -0.127,-2.625
  region: 0.108,-2.625 0.108,-2.159 0.387,-1.88 0.794,-1.88 1.073,-2.159 1.073,-2.625
  region: 1.775,0.708 1.559,0.708 1.28,0.987 1.28,1.394 1.559,1.673 1.775,1.673
  region: 1.775,-0.492 1.559,-0.492 1.28,-0.213 1.28,0.194 1.559,0.473 1.775,0.473
  region: 1.775,-1.692 1.559,-1.692 1.28,-1.413 1.28,-1.006 1.559,-0.727 1.775,-0.727
  region: -1.775,-1.692 -1.559,-1.692 -1.28,-1.413 -1.28,-1.006 -1.559,-0.727 -1.775,-0.727
  region: -1.775,-0.492 -1.559,-0.492 -1.28,-0.213 -1.28,0.194 -1.559,0.473 -1.775,0.473
  region: -1.775,0.708 -1.559,0.708 -1.28,0.987 -1.28,1.394 -1.559,1.673 -1.775,1.673
  region: -1.067,1.448 -0.864,1.651 -0.356,1.651 -0.152,1.448 -0.152,0.94 -0.356,0.737 -0.838,0.737 -1.067,0.965
  region: 0.133,1.448 0.336,1.651 0.844,1.651 1.048,1.448 1.048,0.94 0.844,0.737 0.362,0.737 0.133,0.965
  region: 0.133,0.248 0.336,0.451 0.844,0.451 1.048,0.248 1.048,-0.26 0.844,-0.463 0.362,-0.463 0.133,-0.235
  region: 0.133,-0.952 0.336,-0.749 0.844,-0.749 1.048,-0.952 1.048,-1.46 0.844,-1.663 0.362,-1.663 0.133,-1.435
  region: -1.067,-0.952 -0.864,-0.749 -0.356,-0.749 -0.152,-0.952 -0.152,-1.46 -0.356,-1.663 -0.838,-1.663 -1.067,-1.435
  region: -1.067,0.248 -0.864,0.451 -0.356,0.451 -0.152,0.248 -0.152,-0.26 -0.356,-0.463 -0.838,-0.463 -1.067,-0.235
Top Solder:
  drawing of 24 lines, arcs and shapes, not listed
Mechanical 13:
  circle w0.1: c-1.3,3 r0.5
  lines w0.1: -2.25,-3.95 -2.25,3.95 2.25,3.95 2.25,-3.95 -2.25,-3.95
Mechanical 15:
  lines w0.1: -0.5,0 0.5,0 ; 0,-0.5 0,0.5 ; -3.9,-4.2 -3.9,4.2 3.9,4.2 3.9,-4.2 -3.9,-4.2
3D body: height 1.2, standoff 0.05, extent -2.25,-3.95 2.25,3.95
3D body: height 1.2, standoff 0, extent -1.803,2.515 -0.807,3.513

## TSOP65P640X120_HS-28L [mm] "TSOP, 28-Leads, Body 9,8x4,5mm, Pitch 0,65mm, IPC High Density"
height 1.2
pads (29):
  oval 1.4x0.35 smd mask+0.051: 1(-2.8,4.225) 2(-2.8,3.575) 3(-2.8,2.925) 4(-2.8,2.275) 5(-2.8,1.625) 6(-2.8,0.975) 7(-2.8,0.325) 8(-2.8,-0.325) 9(-2.8,-0.975) 10(-2.8,-1.625) 11(-2.8,-2.275) 12(-2.8,-2.925) 13(-2.8,-3.575) 14(-2.8,-4.225) 15(2.8,-4.225) 16(2.8,-3.575) 17(2.8,-2.925) 18(2.8,-2.275) 19(2.8,-1.625) 20(2.8,-0.975) 21(2.8,-0.325) 22(2.8,0.325) 23(2.8,0.975) 24(2.8,1.625) 25(2.8,2.275) 26(2.8,2.925) 27(2.8,3.575) 28(2.8,4.225)
  rect 3.4x9.7 smd paste-5 mask-5: 29(0,0)
via 1.2,-4.2 diameter 0.65 hole 0.3
via 0,-4.2 diameter 0.65 hole 0.3
via -1.2,-4.2 diameter 0.65 hole 0.3
via 1.2,-3 diameter 0.65 hole 0.3
via 0,-3 diameter 0.65 hole 0.3
via -1.2,-3 diameter 0.65 hole 0.3
via 1.2,-1.8 diameter 0.65 hole 0.3
via 0,-1.8 diameter 0.65 hole 0.3
via -1.2,-1.8 diameter 0.65 hole 0.3
via 1.2,-0.6 diameter 0.65 hole 0.3
via 0,-0.6 diameter 0.65 hole 0.3
via -1.2,-0.6 diameter 0.65 hole 0.3
via 1.2,0.6 diameter 0.65 hole 0.3
via 0,0.6 diameter 0.65 hole 0.3
via -1.2,0.6 diameter 0.65 hole 0.3
via 1.2,1.8 diameter 0.65 hole 0.3
via 0,1.8 diameter 0.65 hole 0.3
via -1.2,1.8 diameter 0.65 hole 0.3
via 1.2,3 diameter 0.65 hole 0.3
via 0,3 diameter 0.65 hole 0.3
via -1.2,3 diameter 0.65 hole 0.3
via 1.2,4.2 diameter 0.65 hole 0.3
via 0,4.2 diameter 0.65 hole 0.3
via -1.2,4.2 diameter 0.65 hole 0.3
Top Overlay:
  circle w0.25: c-2.8,4.95 r0.125
  lines w0.127: -2.25,-4.925 2.25,-4.925 ; -2.25,4.925 2.25,4.925
Top Paste:
  drawing of 36 lines, arcs and shapes, not listed
Top Solder:
  drawing of 24 lines, arcs and shapes, not listed
Mechanical 12:
  circle w0.4: c0,-3 r0.15
  circle w0.4: c0,-1.8 r0.15
  circle w0.4: c0,-0.6 r0.15
  circle w0.4: c0,0.6 r0.15
  circle w0.4: c0,1.8 r0.15
  circle w0.4: c0,3 r0.15
  circle w0.4: c0,4.2 r0.15
  circle w0.4: c1.2,4.2 r0.15
  circle w0.4: c1.2,3 r0.15
  circle w0.4: c1.2,1.8 r0.15
  circle w0.4: c1.2,0.6 r0.15
  circle w0.4: c1.2,-0.6 r0.15
  circle w0.4: c1.2,-1.8 r0.15
  circle w0.4: c1.2,-3 r0.15
  circle w0.4: c1.2,-4.2 r0.15
  circle w0.4: c0,-4.2 r0.15
  circle w0.4: c-1.2,-4.2 r0.15
  circle w0.4: c-1.2,-3 r0.15
  circle w0.4: c-1.2,-1.8 r0.15
  circle w0.4: c-1.2,-0.6 r0.15
  circle w0.4: c-1.2,0.6 r0.15
  circle w0.4: c-1.2,1.8 r0.15
  circle w0.4: c-1.2,3 r0.15
  circle w0.4: c-1.2,4.2 r0.15
Mechanical 13:
  circle w0.1: c-1.3,3.95 r0.5
  lines w0.1: -2.25,-4.9 2.25,-4.9 2.25,4.9 -2.25,4.9 -2.25,-4.9
Mechanical 15:
  lines w0.1: -0.5,0 0.5,0 ; 0,-0.5 0,0.5 ; -3.6,-5 3.6,-5 3.6,5 -3.6,5 -3.6,-5
3D body: height 1.21, standoff 1.2, extent -1.8,3.45 -0.804,4.448
3D body: height 1.2, standoff 0.1, extent -2.25,-4.9 2.25,4.9

## TSOP95P280X110-6N [mm] "TSOP, 6-Leads, Body 3,1x1,7mm (max), Pitch 0,95mm, IPC Medium Density"
height 1.1
pads (6):
  oval 1.4x0.55 smd mask+0.051: 1(-1.2,0.95) 2(-1.2,0) 3(-1.2,-0.95) 4(1.2,-0.95) 5(1.2,0) 6(1.2,0.95)
Top Overlay:
  circle w0.25: c-1.2,1.775 r0.125
  circle w0.6: c0.9,0.55 r0.3
  lines w0.2: -0.1,-1.55 -0.1,1.55 0.1,1.55 0.1,-1.55 -0.1,-1.55
Mechanical 13:
  circle w0.1: c0.1,0.6 r0.5
  lines w0.1: -0.85,-1.55 -0.85,1.55 0.85,1.55 0.85,-1.55 -0.85,-1.55
Mechanical 15:
  lines w0.1: -0.5,0 0.5,0 ; 0,-0.5 0,0.5 ; -2.15,-1.8 -2.15,1.8 2.15,1.8 2.15,-1.8 -2.15,-1.8
3D body: height 1.1, standoff 0.01, extent -0.85,-1.55 0.85,1.55

## TSOT23-5 [mm] "5-LEAD plastic"
height 0.85
pads (5):
  oval 1.27x0.635 smd mask+0.051: 1(-1.31,0.95) 2(-1.31,0) 3(-1.31,-0.95) 4(1.31,-0.95) 5(1.31,0.95)
Top Overlay:
  circle w0.203: c-1.302,1.675 r0.102
  lines w0.102: -0.975,1.675 0.955,1.675 ; -0.95,-1.675 0.98,-1.675 ; 0.965,-0.483 0.965,0.483
Mechanical 13:
  circle w0.1: c-0.3,1 r0.2
  lines w0.102: -0.8,-1.45 0.8,-1.45 0.8,1.45 -0.8,1.45 -0.8,-1.45
Mechanical 15:
  lines w0.051: -2.032,-1.854 2.032,-1.854 2.032,1.854 -2.032,1.854 -2.032,-1.854
  lines w0.102: -0.4,0 0.4,0 ; 0,-0.4 0,0.4
3D body: height 0.3, standoff 0, extent 0.812,-1.175 1.288,-0.725
3D body: height 0.3, standoff 0, extent 0.812,0.725 1.288,1.175
3D body: height 0.3, standoff 0, extent -1.275,-0.225 -0.8,0.225
3D body: height 0.3, standoff 0, extent -1.288,-1.175 -0.812,-0.725
3D body: height 0.3, standoff 0, extent -1.275,0.725 -0.8,1.175
3D body: height 1.45, standoff 0, extent -0.8,-1.45 0.8,1.45
3D body: height 1.46, standoff 1.45, extent -0.504,0.796 -0.096,1.204

## TSQFP40P1600X1600X160-128N [mm] "TSQFP, 128-Leads, Body 16,2x16,2mm (max), Pitch 0,40mm, IPC Medium Density"
height 1.6
pads (130):
  oval 1.75x0.25 smd mask+0.051: 1(-7.575,6.2) 2(-7.575,5.8) 3(-7.575,5.4) 4(-7.575,5) 5(-7.575,4.6) 6(-7.575,4.2) 7(-7.575,3.8) 8(-7.575,3.4) 9(-7.575,3) 10(-7.575,2.6) 11(-7.575,2.2) 12(-7.575,1.8) 13(-7.575,1.4) 14(-7.575,1) 15(-7.575,0.6) 16(-7.575,0.2) 17(-7.575,-0.2) 18(-7.575,-0.6) 19(-7.575,-1) 20(-7.575,-1.4) 21(-7.575,-1.8) 22(-7.575,-2.2) 23(-7.575,-2.6) 24(-7.575,-3) 25(-7.575,-3.4) 26(-7.575,-3.8) 27(-7.575,-4.2) 28(-7.575,-4.6) 29(-7.575,-5) 30(-7.575,-5.4) 31(-7.575,-5.8) 32(-7.575,-6.2) 65(7.575,-6.2) 66(7.575,-5.8) 67(7.575,-5.4) 68(7.575,-5) 69(7.575,-4.6) 70(7.575,-4.2) 71(7.575,-3.8) 72(7.575,-3.4) 73(7.575,-3) 74(7.575,-2.6) 75(7.575,-2.2) 76(7.575,-1.8) 77(7.575,-1.4) 78(7.575,-1) 79(7.575,-0.6) 80(7.575,-0.2) 81(7.575,0.2) 82(7.575,0.6) 83(7.575,1) 84(7.575,1.4) 85(7.575,1.8) 86(7.575,2.2) 87(7.575,2.6) 88(7.575,3) 89(7.575,3.4) 90(7.575,3.8) 91(7.575,4.2) 92(7.575,4.6) 93(7.575,5) 94(7.575,5.4) 95(7.575,5.8) 96(7.575,6.2)
  oval 0.25x1.75 smd mask+0.051: 33(-6.2,-7.575) 34(-5.8,-7.575) 35(-5.4,-7.575) 36(-5,-7.575) 37(-4.6,-7.575) 38(-4.2,-7.575) 39(-3.8,-7.575) 40(-3.4,-7.575) 41(-3,-7.575) 42(-2.6,-7.575) 43(-2.2,-7.575) 44(-1.8,-7.575) 45(-1.4,-7.575) 46(-1,-7.575) 47(-0.6,-7.575) 48(-0.2,-7.575) 49(0.2,-7.575) 50(0.6,-7.575) 51(1,-7.575) 52(1.4,-7.575) 53(1.8,-7.575) 54(2.2,-7.575) 55(2.6,-7.575) 56(3,-7.575) 57(3.4,-7.575) 58(3.8,-7.575) 59(4.2,-7.575) 60(4.6,-7.575) 61(5,-7.575) 62(5.4,-7.575) 63(5.8,-7.575) 64(6.2,-7.575) 97(6.2,7.575) 98(5.8,7.575) 99(5.4,7.575) 100(5,7.575) 101(4.6,7.575) 102(4.2,7.575) 103(3.8,7.575) 104(3.4,7.575) 105(3,7.575) 106(2.6,7.575) 107(2.2,7.575) 108(1.8,7.575) 109(1.4,7.575) 110(1,7.575) 111(0.6,7.575) 112(0.2,7.575) 113(-0.2,7.575) 114(-0.6,7.575) 115(-1,7.575) 116(-1.4,7.575) 117(-1.8,7.575) 118(-2.2,7.575) 119(-2.6,7.575) 120(-3,7.575) 121(-3.4,7.575) 122(-3.8,7.575) 123(-4.2,7.575) 124(-4.6,7.575) 125(-5,7.575) 126(-5.4,7.575) 127(-5.8,7.575) 128(-6.2,7.575)
  round 1.143 smd paste-1.27 mask+0.635: LF1(-7.874,-7.874) LF2(7.874,7.874)
Top Overlay:
  circle w0.25: c-7.575,6.875 r0.125
  circle w0.6: c-5.3,5.3 r0.3
  lines w0.15: -6.3,-6.3 -6.3,6.3 6.3,6.3 6.3,-6.3 -6.3,-6.3
Mechanical 13:
  circle w0.1: c-6.023,6.023 r0.5
  lines w0.127: -7,-7 -7,7 7,7 7,-7 -7,-7
Mechanical 15:
  lines w0.127: -0.5,0 0.5,0 ; 0,-0.5 0,0.5 ; -8.7,-8.7 -8.7,8.7 8.7,8.7 8.7,-8.7 -8.7,-8.7
3D body: height 1.6, standoff 0.1, extent -7,-7 7,7